# Altium schematic symbol library jlcpcb_2025_04_capacitors_extended_0603.schlib: 3668 symbols (part 1 of 20)
Pins are listed as number, name and electrical type; pins without a type are passive.

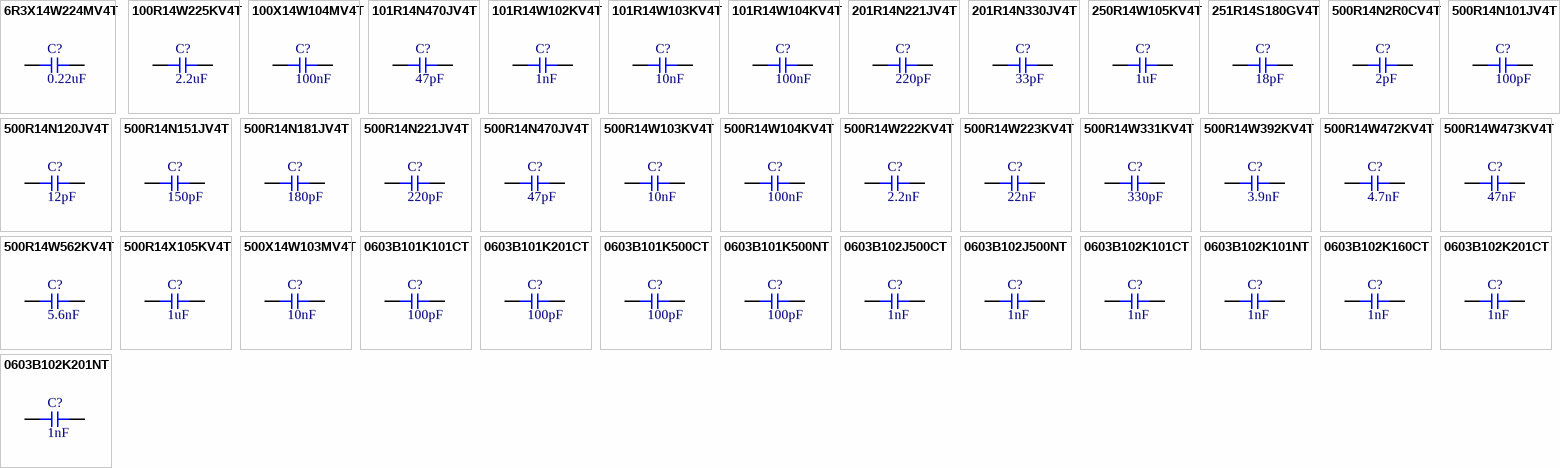
[diagram p0: symbols 6R3X14W224MV4T to 0603B102K201NT]

## 6R3X14W224MV4T
designator C?  Capacitance: 0.22uF  (hidden comment: *)
Capacitor, Ceramic (MLCC), 0.22uF, ±20%, 6.3V, X7R, ±20%, SMD 0603; Manufacturer: Johanson Dielectrics; Manufacturer Part Number: 6R3X14W224MV4T; Package Size: 0603; JLCPCB Basic Part: No; JLCPCB Part Number: C5370270; Supplier 1: LCSC; Category: Capacitors - MLCC; Supplier Part Number 1: C5370270; Tolerance: ±20%; Voltage Rating: 6.3V; Temperature Coefficient: X7R; RoHS: Yes; ComponentLink1Description: Datasheet; ComponentLink1URL: https://wmsc.lcsc.com/wmsc/upload/file/pdf/v2/lcsc/2304071000_Johanson-Dielectrics-6R3X14W224MV4T_C5370270.pdf; ComponentLink2Description: JLCPCB Part URL; ComponentLink2URL: https://jlcpcb.com/partdetail/C5370270; ComponentLink3Description: LCSC Part URL; ComponentLink3URL: https://lcsc.com/product-detail/Multilayer-Ceramic-Capacitors-MLCC---SMD-SMT_Johanson-Dielectrics-Johanson-Dielectrics-6R3X14W224MV4T_C5370270.html
footprint CAP-0603 (0603 (1608M) Capacitor)
pins: 1, 2

## 100R14W225KV4T
designator C?  Capacitance: 2.2uF  (hidden comment: *)
Capacitor, Ceramic (MLCC), 2.2uF, ±10%, 10V, X7R, ±10%, SMD 0603; Manufacturer: Johanson Dielectrics; Manufacturer Part Number: 100R14W225KV4T; Package Size: 0603; JLCPCB Basic Part: No; JLCPCB Part Number: C2917682; Supplier 1: LCSC; Category: Capacitors - MLCC; Supplier Part Number 1: C2917682; Tolerance: ±10%; Voltage Rating: 10V; Temperature Coefficient: X7R; RoHS: Yes; ComponentLink1Description: Datasheet; ComponentLink1URL: https://wmsc.lcsc.com/wmsc/upload/file/pdf/v2/lcsc/2303281630_Johanson-Dielectrics-100R14W225KV4T_C2917682.pdf; ComponentLink2Description: JLCPCB Part URL; ComponentLink2URL: https://jlcpcb.com/partdetail/C2917682; ComponentLink3Description: LCSC Part URL; ComponentLink3URL: https://lcsc.com/product-detail/Multilayer-Ceramic-Capacitors-MLCC---SMD-SMT_Johanson-Dielectrics-Johanson-Dielectrics-100R14W225KV4T_C2917682.html
footprint CAP-0603 (0603 (1608M) Capacitor)
pins: 1, 2

## 100X14W104MV4T
designator C?  Capacitance: 100nF  (hidden comment: *)
Capacitor, Ceramic (MLCC), 100nF, ±20%, 10V, X7R, ±20%, SMD 0603; Manufacturer: Johanson Dielectrics; Manufacturer Part Number: 100X14W104MV4T; Package Size: 0603; JLCPCB Basic Part: No; JLCPCB Part Number: C2167449; Supplier 1: LCSC; Category: Capacitors - MLCC; Supplier Part Number 1: C2167449; Tolerance: ±20%; Voltage Rating: 10V; Temperature Coefficient: X7R; RoHS: Yes; ComponentLink1Description: Datasheet; ComponentLink1URL: https://wmsc.lcsc.com/wmsc/upload/file/pdf/v2/lcsc/2304140030_Johanson-Dielectrics-100X14W104MV4T_C2167449.pdf; ComponentLink2Description: JLCPCB Part URL; ComponentLink2URL: https://jlcpcb.com/partdetail/C2167449; ComponentLink3Description: LCSC Part URL; ComponentLink3URL: https://lcsc.com/product-detail/Multilayer-Ceramic-Capacitors-MLCC---SMD-SMT_Johanson-Dielectrics-Johanson-Dielectrics-100X14W104MV4T_C2167449.html
footprint CAP-0603 (0603 (1608M) Capacitor)
pins: 1, 2

## 101R14N470JV4T
designator C?  Capacitance: 47pF  (hidden comment: *)
Capacitor, Ceramic (MLCC), 47pF, ±5%, 100V, NP0, ±5%, SMD 0603; Manufacturer: Johanson Dielectrics; Manufacturer Part Number: 101R14N470JV4T; Package Size: 0603; JLCPCB Basic Part: No; JLCPCB Part Number: C431639; Supplier 1: LCSC; Category: Capacitors - MLCC; Supplier Part Number 1: C431639; Tolerance: ±5%; Voltage Rating: 100V; Temperature Coefficient: NP0; RoHS: Yes; ComponentLink1Description: Datasheet; ComponentLink1URL: https://wmsc.lcsc.com/wmsc/upload/file/pdf/v2/lcsc/2304140030_Johanson-Dielectrics-101R14N470JV4T_C431639.pdf; ComponentLink2Description: JLCPCB Part URL; ComponentLink2URL: https://jlcpcb.com/partdetail/C431639; ComponentLink3Description: LCSC Part URL; ComponentLink3URL: https://lcsc.com/product-detail/Multilayer-Ceramic-Capacitors-MLCC---SMD-SMT_Johanson-Dielectrics-Johanson-Dielectrics-101R14N470JV4T_C431639.html
footprint CAP-0603 (0603 (1608M) Capacitor)
pins: 1, 2

## 101R14W102KV4T
designator C?  Capacitance: 1nF  (hidden comment: *)
Capacitor, Ceramic (MLCC), 1nF, 100V, X7R, SMD 0603; Manufacturer: Johanson Dielectrics; Manufacturer Part Number: 101R14W102KV4T; Package Size: 0603; JLCPCB Basic Part: No; JLCPCB Part Number: C2917686; Supplier 1: LCSC; Category: Capacitors - MLCC; Supplier Part Number 1: C2917686; Voltage Rating: 100V; Temperature Coefficient: X7R; RoHS: Yes; ComponentLink1Description: Datasheet; ComponentLink1URL: https://wmsc.lcsc.com/wmsc/upload/file/pdf/v2/lcsc/2203311630_Johanson-Dielectrics-101R14W102KV4T_C2917686.pdf; ComponentLink2Description: JLCPCB Part URL; ComponentLink2URL: https://jlcpcb.com/partdetail/C2917686; ComponentLink3Description: LCSC Part URL; ComponentLink3URL: https://lcsc.com/product-detail/Multilayer-Ceramic-Capacitors-MLCC---SMD-SMT_Johanson-Dielectrics-Johanson-Dielectrics-101R14W102KV4T_C2917686.html
footprint CAP-0603 (0603 (1608M) Capacitor)
pins: 1, 2

## 101R14W103KV4T
designator C?  Capacitance: 10nF  (hidden comment: *)
Capacitor, Ceramic (MLCC), 10nF, ±10%, 100V, X7R, ±10%, SMD 0603; Manufacturer: Johanson Dielectrics; Manufacturer Part Number: 101R14W103KV4T; Package Size: 0603; JLCPCB Basic Part: No; JLCPCB Part Number: C431000; Supplier 1: LCSC; Category: Capacitors - MLCC; Supplier Part Number 1: C431000; Tolerance: ±10%; Voltage Rating: 100V; Temperature Coefficient: X7R; RoHS: Yes; ComponentLink1Description: Datasheet; ComponentLink1URL: https://wmsc.lcsc.com/wmsc/upload/file/pdf/v2/lcsc/1912111437_Johanson-Dielectrics-101R14W103KV4T_C431000.pdf; ComponentLink2Description: JLCPCB Part URL; ComponentLink2URL: https://jlcpcb.com/partdetail/C431000; ComponentLink3Description: LCSC Part URL; ComponentLink3URL: https://lcsc.com/product-detail/Multilayer-Ceramic-Capacitors-MLCC---SMD-SMT_Johanson-Dielectrics-Johanson-Dielectrics-101R14W103KV4T_C431000.html
footprint CAP-0603 (0603 (1608M) Capacitor)
pins: 1, 2

## 101R14W104KV4T
designator C?  Capacitance: 100nF  (hidden comment: *)
Capacitor, Ceramic (MLCC), 100nF, ±10%, 100V, X7R, ±10%, SMD 0603; Manufacturer: Johanson Dielectrics; Manufacturer Part Number: 101R14W104KV4T; Package Size: 0603; JLCPCB Basic Part: No; JLCPCB Part Number: C431640; Supplier 1: LCSC; Category: Capacitors - MLCC; Supplier Part Number 1: C431640; Tolerance: ±10%; Voltage Rating: 100V; Temperature Coefficient: X7R; RoHS: Yes; ComponentLink1Description: Datasheet; ComponentLink1URL: https://wmsc.lcsc.com/wmsc/upload/file/pdf/v2/lcsc/2304140030_Johanson-Dielectrics-101R14W104KV4T_C431640.pdf; ComponentLink2Description: JLCPCB Part URL; ComponentLink2URL: https://jlcpcb.com/partdetail/C431640; ComponentLink3Description: LCSC Part URL; ComponentLink3URL: https://lcsc.com/product-detail/Multilayer-Ceramic-Capacitors-MLCC---SMD-SMT_Johanson-Dielectrics-Johanson-Dielectrics-101R14W104KV4T_C431640.html
footprint CAP-0603 (0603 (1608M) Capacitor)
pins: 1, 2

## 201R14N221JV4T
designator C?  Capacitance: 220pF  (hidden comment: *)
Capacitor, Ceramic (MLCC), 220pF, 200V, SMD 0603; Manufacturer: Johanson Dielectrics; Manufacturer Part Number: 201R14N221JV4T; Package Size: 0603; JLCPCB Basic Part: No; JLCPCB Part Number: C2917711; Supplier 1: LCSC; Category: Capacitors - MLCC; Supplier Part Number 1: C2917711; Voltage Rating: 200V; RoHS: Yes; ComponentLink1Description: Datasheet; ComponentLink1URL: https://wmsc.lcsc.com/wmsc/upload/file/pdf/v2/lcsc/2206291630_Johanson-Dielectrics-201R14N221JV4T_C2917711.pdf; ComponentLink2Description: JLCPCB Part URL; ComponentLink2URL: https://jlcpcb.com/partdetail/C2917711; ComponentLink3Description: LCSC Part URL; ComponentLink3URL: https://lcsc.com/product-detail/Multilayer-Ceramic-Capacitors-MLCC---SMD-SMT_Johanson-Dielectrics-Johanson-Dielectrics-201R14N221JV4T_C2917711.html
footprint CAP-0603 (0603 (1608M) Capacitor)
pins: 1, 2

## 201R14N330JV4T
designator C?  Capacitance: 33pF  (hidden comment: *)
Capacitor, Ceramic (MLCC), 33pF, 200V, SMD 0603; Manufacturer: Johanson Dielectrics; Manufacturer Part Number: 201R14N330JV4T; Package Size: 0603; JLCPCB Basic Part: No; JLCPCB Part Number: C2917713; Supplier 1: LCSC; Category: Capacitors - MLCC; Supplier Part Number 1: C2917713; Voltage Rating: 200V; RoHS: Yes; ComponentLink1Description: Datasheet; ComponentLink1URL: https://wmsc.lcsc.com/wmsc/upload/file/pdf/v2/lcsc/2205250916_Johanson-Dielectrics-201R14N330JV4T_C2917713.pdf; ComponentLink2Description: JLCPCB Part URL; ComponentLink2URL: https://jlcpcb.com/partdetail/C2917713; ComponentLink3Description: LCSC Part URL; ComponentLink3URL: https://lcsc.com/product-detail/Multilayer-Ceramic-Capacitors-MLCC---SMD-SMT_Johanson-Dielectrics-Johanson-Dielectrics-201R14N330JV4T_C2917713.html
footprint CAP-0603 (0603 (1608M) Capacitor)
pins: 1, 2

## 250R14W105KV4T
designator C?  Capacitance: 1uF  (hidden comment: *)
Capacitor, Ceramic (MLCC), 1uF, ±10%, 25V, X7R, ±10%, SMD 0603; Manufacturer: Johanson Dielectrics; Manufacturer Part Number: 250R14W105KV4T; Package Size: 0603; JLCPCB Basic Part: No; JLCPCB Part Number: C431003; Supplier 1: LCSC; Category: Capacitors - MLCC; Supplier Part Number 1: C431003; Tolerance: ±10%; Voltage Rating: 25V; Temperature Coefficient: X7R; RoHS: Yes; ComponentLink1Description: Datasheet; ComponentLink1URL: https://wmsc.lcsc.com/wmsc/upload/file/pdf/v2/lcsc/2304140030_Johanson-Dielectrics-250R14W105KV4T_C431003.pdf; ComponentLink2Description: JLCPCB Part URL; ComponentLink2URL: https://jlcpcb.com/partdetail/C431003; ComponentLink3Description: LCSC Part URL; ComponentLink3URL: https://lcsc.com/product-detail/Multilayer-Ceramic-Capacitors-MLCC---SMD-SMT_Johanson-Dielectrics-Johanson-Dielectrics-250R14W105KV4T_C431003.html
footprint CAP-0603 (0603 (1608M) Capacitor)
pins: 1, 2

## 251R14S180GV4T
designator C?  Capacitance: 18pF  (hidden comment: *)
Capacitor, Ceramic (MLCC), 18pF, ±2%, 250V, C0G, ±2%, SMD 0603; Manufacturer: Johanson Dielectrics; Manufacturer Part Number: 251R14S180GV4T; Package Size: 0603; JLCPCB Basic Part: No; JLCPCB Part Number: C3881816; Supplier 1: LCSC; Category: Capacitors - MLCC; Supplier Part Number 1: C3881816; Tolerance: ±2%; Voltage Rating: 250V; Temperature Coefficient: C0G; RoHS: Yes; ComponentLink1Description: Datasheet; ComponentLink2Description: JLCPCB Part URL; ComponentLink2URL: https://jlcpcb.com/partdetail/C3881816; ComponentLink3Description: LCSC Part URL; ComponentLink3URL: https://lcsc.com/product-detail/Multilayer-Ceramic-Capacitors-MLCC---SMD-SMT_Johanson-Dielectrics-Johanson-Dielectrics-251R14S180GV4T_C3881816.html
footprint CAP-0603 (0603 (1608M) Capacitor)
pins: 1, 2

## 500R14N2R0CV4T
designator C?  Capacitance: 2pF  (hidden comment: *)
Capacitor, Ceramic (MLCC), 2pF, 50V, NP0, SMD 0603; Manufacturer: Johanson Dielectrics; Manufacturer Part Number: 500R14N2R0CV4T; Package Size: 0603; JLCPCB Basic Part: No; JLCPCB Part Number: C2917750; Supplier 1: LCSC; Category: Capacitors - MLCC; Supplier Part Number 1: C2917750; Voltage Rating: 50V; Temperature Coefficient: NP0; RoHS: Yes; ComponentLink1Description: Datasheet; ComponentLink1URL: https://wmsc.lcsc.com/wmsc/upload/file/pdf/v2/lcsc/2203311730_Johanson-Dielectrics-500R14N2R0CV4T_C2917750.pdf; ComponentLink2Description: JLCPCB Part URL; ComponentLink2URL: https://jlcpcb.com/partdetail/C2917750; ComponentLink3Description: LCSC Part URL; ComponentLink3URL: https://lcsc.com/product-detail/Multilayer-Ceramic-Capacitors-MLCC---SMD-SMT_Johanson-Dielectrics-Johanson-Dielectrics-500R14N2R0CV4T_C2917750.html
footprint CAP-0603 (0603 (1608M) Capacitor)
pins: 1, 2

## 500R14N101JV4T
designator C?  Capacitance: 100pF  (hidden comment: *)
Capacitor, Ceramic (MLCC), 100pF, ±5%, 50V, NP0, ±5%, SMD 0603; Manufacturer: Johanson Dielectrics; Manufacturer Part Number: 500R14N101JV4T; Package Size: 0603; JLCPCB Basic Part: No; JLCPCB Part Number: C173273; Supplier 1: LCSC; Category: Capacitors - MLCC; Supplier Part Number 1: C173273; Tolerance: ±5%; Voltage Rating: 50V; Temperature Coefficient: NP0; RoHS: Yes; ComponentLink1Description: Datasheet; ComponentLink1URL: https://wmsc.lcsc.com/wmsc/upload/file/pdf/v2/lcsc/2304140030_Johanson-Dielectrics-500R14N101JV4T_C173273.pdf; ComponentLink2Description: JLCPCB Part URL; ComponentLink2URL: https://jlcpcb.com/partdetail/C173273; ComponentLink3Description: LCSC Part URL; ComponentLink3URL: https://lcsc.com/product-detail/Multilayer-Ceramic-Capacitors-MLCC---SMD-SMT_Johanson-Dielectrics-Johanson-Dielectrics-500R14N101JV4T_C173273.html
footprint CAP-0603 (0603 (1608M) Capacitor)
pins: 1, 2

## 500R14N120JV4T
designator C?  Capacitance: 12pF  (hidden comment: *)
Capacitor, Ceramic (MLCC), 12pF, ±5%, 50V, NP0, ±5%, SMD 0603; Manufacturer: Johanson Dielectrics; Manufacturer Part Number: 500R14N120JV4T; Package Size: 0603; JLCPCB Basic Part: No; JLCPCB Part Number: C2176561; Supplier 1: LCSC; Category: Capacitors - MLCC; Supplier Part Number 1: C2176561; Tolerance: ±5%; Voltage Rating: 50V; Temperature Coefficient: NP0; RoHS: Yes; ComponentLink1Description: Datasheet; ComponentLink1URL: https://wmsc.lcsc.com/wmsc/upload/file/pdf/v2/lcsc/2304140030_Johanson-Dielectrics-500R14N120JV4T_C2176561.pdf; ComponentLink2Description: JLCPCB Part URL; ComponentLink2URL: https://jlcpcb.com/partdetail/C2176561; ComponentLink3Description: LCSC Part URL; ComponentLink3URL: https://lcsc.com/product-detail/Multilayer-Ceramic-Capacitors-MLCC---SMD-SMT_Johanson-Dielectrics-Johanson-Dielectrics-500R14N120JV4T_C2176561.html
footprint CAP-0603 (0603 (1608M) Capacitor)
pins: 1, 2

## 500R14N151JV4T
designator C?  Capacitance: 150pF  (hidden comment: *)
Capacitor, Ceramic (MLCC), 150pF, ±5%, 50V, NP0, ±5%, SMD 0603; Manufacturer: Johanson Dielectrics; Manufacturer Part Number: 500R14N151JV4T; Package Size: 0603; JLCPCB Basic Part: No; JLCPCB Part Number: C431009; Supplier 1: LCSC; Category: Capacitors - MLCC; Supplier Part Number 1: C431009; Tolerance: ±5%; Voltage Rating: 50V; Temperature Coefficient: NP0; RoHS: Yes; ComponentLink1Description: Datasheet; ComponentLink1URL: https://wmsc.lcsc.com/wmsc/upload/file/pdf/v2/lcsc/2304140030_Johanson-Dielectrics-500R14N151JV4T_C431009.pdf; ComponentLink2Description: JLCPCB Part URL; ComponentLink2URL: https://jlcpcb.com/partdetail/C431009; ComponentLink3Description: LCSC Part URL; ComponentLink3URL: https://lcsc.com/product-detail/Multilayer-Ceramic-Capacitors-MLCC---SMD-SMT_Johanson-Dielectrics-Johanson-Dielectrics-500R14N151JV4T_C431009.html
footprint CAP-0603 (0603 (1608M) Capacitor)
pins: 1, 2

## 500R14N181JV4T
designator C?  Capacitance: 180pF  (hidden comment: *)
Capacitor, Ceramic (MLCC), 180pF, ±5%, 50V, NP0, ±5%, SMD 0603; Manufacturer: Johanson Dielectrics; Manufacturer Part Number: 500R14N181JV4T; Package Size: 0603; JLCPCB Basic Part: No; JLCPCB Part Number: C2917748; Supplier 1: LCSC; Category: Capacitors - MLCC; Supplier Part Number 1: C2917748; Tolerance: ±5%; Voltage Rating: 50V; Temperature Coefficient: NP0; RoHS: Yes; ComponentLink1Description: Datasheet; ComponentLink1URL: https://wmsc.lcsc.com/wmsc/upload/file/pdf/v2/lcsc/2203311630_Johanson-Dielectrics-500R14N181JV4T_C2917748.pdf; ComponentLink2Description: JLCPCB Part URL; ComponentLink2URL: https://jlcpcb.com/partdetail/C2917748; ComponentLink3Description: LCSC Part URL; ComponentLink3URL: https://lcsc.com/product-detail/Multilayer-Ceramic-Capacitors-MLCC---SMD-SMT_Johanson-Dielectrics-Johanson-Dielectrics-500R14N181JV4T_C2917748.html
footprint CAP-0603 (0603 (1608M) Capacitor)
pins: 1, 2

## 500R14N221JV4T
designator C?  Capacitance: 220pF  (hidden comment: *)
Capacitor, Ceramic (MLCC), 220pF, ±5%, 50V, NP0, ±5%, SMD 0603; Manufacturer: Johanson Dielectrics; Manufacturer Part Number: 500R14N221JV4T; Package Size: 0603; JLCPCB Basic Part: No; JLCPCB Part Number: C431002; Supplier 1: LCSC; Category: Capacitors - MLCC; Supplier Part Number 1: C431002; Tolerance: ±5%; Voltage Rating: 50V; Temperature Coefficient: NP0; RoHS: Yes; ComponentLink1Description: Datasheet; ComponentLink1URL: https://wmsc.lcsc.com/wmsc/upload/file/pdf/v2/lcsc/2304140030_Johanson-Dielectrics-500R14N221JV4T_C431002.pdf; ComponentLink2Description: JLCPCB Part URL; ComponentLink2URL: https://jlcpcb.com/partdetail/C431002; ComponentLink3Description: LCSC Part URL; ComponentLink3URL: https://lcsc.com/product-detail/Multilayer-Ceramic-Capacitors-MLCC---SMD-SMT_Johanson-Dielectrics-Johanson-Dielectrics-500R14N221JV4T_C431002.html
footprint CAP-0603 (0603 (1608M) Capacitor)
pins: 1, 2

## 500R14N470JV4T
designator C?  Capacitance: 47pF  (hidden comment: *)
Capacitor, Ceramic (MLCC), 47pF, ±5%, 50V, NP0, ±5%, SMD 0603; Manufacturer: Johanson Dielectrics; Manufacturer Part Number: 500R14N470JV4T; Package Size: 0603; JLCPCB Basic Part: No; JLCPCB Part Number: C173269; Supplier 1: LCSC; Category: Capacitors - MLCC; Supplier Part Number 1: C173269; Tolerance: ±5%; Voltage Rating: 50V; Temperature Coefficient: NP0; RoHS: Yes; ComponentLink1Description: Datasheet; ComponentLink1URL: https://wmsc.lcsc.com/wmsc/upload/file/pdf/v2/lcsc/2304140030_Johanson-Dielectrics-500R14N470JV4T_C173269.pdf; ComponentLink2Description: JLCPCB Part URL; ComponentLink2URL: https://jlcpcb.com/partdetail/C173269; ComponentLink3Description: LCSC Part URL; ComponentLink3URL: https://lcsc.com/product-detail/Multilayer-Ceramic-Capacitors-MLCC---SMD-SMT_Johanson-Dielectrics-Johanson-Dielectrics-500R14N470JV4T_C173269.html
footprint CAP-0603 (0603 (1608M) Capacitor)
pins: 1, 2

## 500R14W103KV4T
designator C?  Capacitance: 10nF  (hidden comment: *)
Capacitor, Ceramic (MLCC), 10nF, ±10%, 50V, X7R, ±10%, SMD 0603; Manufacturer: Johanson Dielectrics; Manufacturer Part Number: 500R14W103KV4T; Package Size: 0603; JLCPCB Basic Part: No; JLCPCB Part Number: C173276; Supplier 1: LCSC; Category: Capacitors - MLCC; Supplier Part Number 1: C173276; Tolerance: ±10%; Voltage Rating: 50V; Temperature Coefficient: X7R; RoHS: Yes; ComponentLink1Description: Datasheet; ComponentLink1URL: https://wmsc.lcsc.com/wmsc/upload/file/pdf/v2/lcsc/2304140030_Johanson-Dielectrics-500R14W103KV4T_C173276.pdf; ComponentLink2Description: JLCPCB Part URL; ComponentLink2URL: https://jlcpcb.com/partdetail/C173276; ComponentLink3Description: LCSC Part URL; ComponentLink3URL: https://lcsc.com/product-detail/Multilayer-Ceramic-Capacitors-MLCC---SMD-SMT_Johanson-Dielectrics-Johanson-Dielectrics-500R14W103KV4T_C173276.html
footprint CAP-0603 (0603 (1608M) Capacitor)
pins: 1, 2

## 500R14W104KV4T
designator C?  Capacitance: 100nF  (hidden comment: *)
Capacitor, Ceramic (MLCC), 100nF, ±10%, 50V, X7R, ±10%, SMD 0603; Manufacturer: Johanson Dielectrics; Manufacturer Part Number: 500R14W104KV4T; Package Size: 0603; JLCPCB Basic Part: No; JLCPCB Part Number: C173232; Supplier 1: LCSC; Category: Capacitors - MLCC; Supplier Part Number 1: C173232; Tolerance: ±10%; Voltage Rating: 50V; Temperature Coefficient: X7R; RoHS: Yes; ComponentLink1Description: Datasheet; ComponentLink1URL: https://wmsc.lcsc.com/wmsc/upload/file/pdf/v2/lcsc/2304140030_Johanson-Dielectrics-500R14W104KV4T_C173232.pdf; ComponentLink2Description: JLCPCB Part URL; ComponentLink2URL: https://jlcpcb.com/partdetail/C173232; ComponentLink3Description: LCSC Part URL; ComponentLink3URL: https://lcsc.com/product-detail/Multilayer-Ceramic-Capacitors-MLCC---SMD-SMT_Johanson-Dielectrics-Johanson-Dielectrics-500R14W104KV4T_C173232.html
footprint CAP-0603 (0603 (1608M) Capacitor)
pins: 1, 2

## 500R14W222KV4T
designator C?  Capacitance: 2.2nF  (hidden comment: *)
Capacitor, Ceramic (MLCC), 2.2nF, ±10%, 50V, X7R, ±10%, SMD 0603; Manufacturer: Johanson Dielectrics; Manufacturer Part Number: 500R14W222KV4T; Package Size: 0603; JLCPCB Basic Part: No; JLCPCB Part Number: C431660; Supplier 1: LCSC; Category: Capacitors - MLCC; Supplier Part Number 1: C431660; Tolerance: ±10%; Voltage Rating: 50V; Temperature Coefficient: X7R; RoHS: Yes; ComponentLink1Description: Datasheet; ComponentLink1URL: https://wmsc.lcsc.com/wmsc/upload/file/pdf/v2/lcsc/2304140030_Johanson-Dielectrics-500R14W222KV4T_C431660.pdf; ComponentLink2Description: JLCPCB Part URL; ComponentLink2URL: https://jlcpcb.com/partdetail/C431660; ComponentLink3Description: LCSC Part URL; ComponentLink3URL: https://lcsc.com/product-detail/Multilayer-Ceramic-Capacitors-MLCC---SMD-SMT_Johanson-Dielectrics-Johanson-Dielectrics-500R14W222KV4T_C431660.html
footprint CAP-0603 (0603 (1608M) Capacitor)
pins: 1, 2

## 500R14W223KV4T
designator C?  Capacitance: 22nF  (hidden comment: *)
Capacitor, Ceramic (MLCC), 22nF, ±10%, 50V, X7R, ±10%, SMD 0603; Manufacturer: Johanson Dielectrics; Manufacturer Part Number: 500R14W223KV4T; Package Size: 0603; JLCPCB Basic Part: No; JLCPCB Part Number: C431661; Supplier 1: LCSC; Category: Capacitors - MLCC; Supplier Part Number 1: C431661; Tolerance: ±10%; Voltage Rating: 50V; Temperature Coefficient: X7R; RoHS: Yes; ComponentLink1Description: Datasheet; ComponentLink1URL: https://wmsc.lcsc.com/wmsc/upload/file/pdf/v2/lcsc/2304140030_Johanson-Dielectrics-500R14W223KV4T_C431661.pdf; ComponentLink2Description: JLCPCB Part URL; ComponentLink2URL: https://jlcpcb.com/partdetail/C431661; ComponentLink3Description: LCSC Part URL; ComponentLink3URL: https://lcsc.com/product-detail/Multilayer-Ceramic-Capacitors-MLCC---SMD-SMT_Johanson-Dielectrics-Johanson-Dielectrics-500R14W223KV4T_C431661.html
footprint CAP-0603 (0603 (1608M) Capacitor)
pins: 1, 2

## 500R14W331KV4T
designator C?  Capacitance: 330pF  (hidden comment: *)
Capacitor, Ceramic (MLCC), 330pF, ±10%, 50V, X7R, ±10%, SMD 0603; Manufacturer: Johanson Dielectrics; Manufacturer Part Number: 500R14W331KV4T; Package Size: 0603; JLCPCB Basic Part: No; JLCPCB Part Number: C431008; Supplier 1: LCSC; Category: Capacitors - MLCC; Supplier Part Number 1: C431008; Tolerance: ±10%; Voltage Rating: 50V; Temperature Coefficient: X7R; RoHS: Yes; ComponentLink1Description: Datasheet; ComponentLink1URL: https://wmsc.lcsc.com/wmsc/upload/file/pdf/v2/lcsc/2304140030_Johanson-Dielectrics-500R14W331KV4T_C431008.pdf; ComponentLink2Description: JLCPCB Part URL; ComponentLink2URL: https://jlcpcb.com/partdetail/C431008; ComponentLink3Description: LCSC Part URL; ComponentLink3URL: https://lcsc.com/product-detail/Multilayer-Ceramic-Capacitors-MLCC---SMD-SMT_Johanson-Dielectrics-Johanson-Dielectrics-500R14W331KV4T_C431008.html
footprint CAP-0603 (0603 (1608M) Capacitor)
pins: 1, 2

## 500R14W392KV4T
designator C?  Capacitance: 3.9nF  (hidden comment: *)
Capacitor, Ceramic (MLCC), 3.9nF, ±10%, 50V, X7R, ±10%, SMD 0603; Manufacturer: Johanson Dielectrics; Manufacturer Part Number: 500R14W392KV4T; Package Size: 0603; JLCPCB Basic Part: No; JLCPCB Part Number: C431663; Supplier 1: LCSC; Category: Capacitors - MLCC; Supplier Part Number 1: C431663; Tolerance: ±10%; Voltage Rating: 50V; Temperature Coefficient: X7R; RoHS: Yes; ComponentLink1Description: Datasheet; ComponentLink1URL: https://wmsc.lcsc.com/wmsc/upload/file/pdf/v2/lcsc/2304140030_Johanson-Dielectrics-500R14W392KV4T_C431663.pdf; ComponentLink2Description: JLCPCB Part URL; ComponentLink2URL: https://jlcpcb.com/partdetail/C431663; ComponentLink3Description: LCSC Part URL; ComponentLink3URL: https://lcsc.com/product-detail/Multilayer-Ceramic-Capacitors-MLCC---SMD-SMT_Johanson-Dielectrics-Johanson-Dielectrics-500R14W392KV4T_C431663.html
footprint CAP-0603 (0603 (1608M) Capacitor)
pins: 1, 2

## 500R14W472KV4T
designator C?  Capacitance: 4.7nF  (hidden comment: *)
Capacitor, Ceramic (MLCC), 4.7nF, ±10%, 50V, X7R, ±10%, SMD 0603; Manufacturer: Johanson Dielectrics; Manufacturer Part Number: 500R14W472KV4T; Package Size: 0603; JLCPCB Basic Part: No; JLCPCB Part Number: C430999; Supplier 1: LCSC; Category: Capacitors - MLCC; Supplier Part Number 1: C430999; Tolerance: ±10%; Voltage Rating: 50V; Temperature Coefficient: X7R; RoHS: Yes; ComponentLink1Description: Datasheet; ComponentLink1URL: https://wmsc.lcsc.com/wmsc/upload/file/pdf/v2/lcsc/2304140030_Johanson-Dielectrics-500R14W472KV4T_C430999.pdf; ComponentLink2Description: JLCPCB Part URL; ComponentLink2URL: https://jlcpcb.com/partdetail/C430999; ComponentLink3Description: LCSC Part URL; ComponentLink3URL: https://lcsc.com/product-detail/Multilayer-Ceramic-Capacitors-MLCC---SMD-SMT_Johanson-Dielectrics-Johanson-Dielectrics-500R14W472KV4T_C430999.html
footprint CAP-0603 (0603 (1608M) Capacitor)
pins: 1, 2

## 500R14W473KV4T
designator C?  Capacitance: 47nF  (hidden comment: *)
Capacitor, Ceramic (MLCC), 47nF, ±10%, 50V, X7R, ±10%, SMD 0603; Manufacturer: Johanson Dielectrics; Manufacturer Part Number: 500R14W473KV4T; Package Size: 0603; JLCPCB Basic Part: No; JLCPCB Part Number: C430998; Supplier 1: LCSC; Category: Capacitors - MLCC; Supplier Part Number 1: C430998; Tolerance: ±10%; Voltage Rating: 50V; Temperature Coefficient: X7R; RoHS: Yes; ComponentLink1Description: Datasheet; ComponentLink1URL: https://wmsc.lcsc.com/wmsc/upload/file/pdf/v2/lcsc/2304140030_Johanson-Dielectrics-500R14W473KV4T_C430998.pdf; ComponentLink2Description: JLCPCB Part URL; ComponentLink2URL: https://jlcpcb.com/partdetail/C430998; ComponentLink3Description: LCSC Part URL; ComponentLink3URL: https://lcsc.com/product-detail/Multilayer-Ceramic-Capacitors-MLCC---SMD-SMT_Johanson-Dielectrics-Johanson-Dielectrics-500R14W473KV4T_C430998.html
footprint CAP-0603 (0603 (1608M) Capacitor)
pins: 1, 2

## 500R14W562KV4T
designator C?  Capacitance: 5.6nF  (hidden comment: *)
Capacitor, Ceramic (MLCC), 5.6nF, ±10%, 50V, X7R, ±10%, SMD 0603; Manufacturer: Johanson Dielectrics; Manufacturer Part Number: 500R14W562KV4T; Package Size: 0603; JLCPCB Basic Part: No; JLCPCB Part Number: C431664; Supplier 1: LCSC; Category: Capacitors - MLCC; Supplier Part Number 1: C431664; Tolerance: ±10%; Voltage Rating: 50V; Temperature Coefficient: X7R; RoHS: Yes; ComponentLink1Description: Datasheet; ComponentLink1URL: https://wmsc.lcsc.com/wmsc/upload/file/pdf/v2/lcsc/2304140030_Johanson-Dielectrics-500R14W562KV4T_C431664.pdf; ComponentLink2Description: JLCPCB Part URL; ComponentLink2URL: https://jlcpcb.com/partdetail/C431664; ComponentLink3Description: LCSC Part URL; ComponentLink3URL: https://lcsc.com/product-detail/Multilayer-Ceramic-Capacitors-MLCC---SMD-SMT_Johanson-Dielectrics-Johanson-Dielectrics-500R14W562KV4T_C431664.html
footprint CAP-0603 (0603 (1608M) Capacitor)
pins: 1, 2

## 500R14X105KV4T
designator C?  Capacitance: 1uF  (hidden comment: *)
Capacitor, Ceramic (MLCC), 1uF, ±10%, 50V, X5R, ±10%, SMD 0603; Manufacturer: Johanson Dielectrics; Manufacturer Part Number: 500R14X105KV4T; Package Size: 0603; JLCPCB Basic Part: No; JLCPCB Part Number: C431665; Supplier 1: LCSC; Category: Capacitors - MLCC; Supplier Part Number 1: C431665; Tolerance: ±10%; Voltage Rating: 50V; Temperature Coefficient: X5R; RoHS: Yes; ComponentLink1Description: Datasheet; ComponentLink1URL: https://wmsc.lcsc.com/wmsc/upload/file/pdf/v2/lcsc/1912111437_Johanson-Dielectrics-500R14X105KV4T_C431665.pdf; ComponentLink2Description: JLCPCB Part URL; ComponentLink2URL: https://jlcpcb.com/partdetail/C431665; ComponentLink3Description: LCSC Part URL; ComponentLink3URL: https://lcsc.com/product-detail/Multilayer-Ceramic-Capacitors-MLCC---SMD-SMT_Johanson-Dielectrics-Johanson-Dielectrics-500R14X105KV4T_C431665.html
footprint CAP-0603 (0603 (1608M) Capacitor)
pins: 1, 2

## 500X14W103MV4T
designator C?  Capacitance: 10nF  (hidden comment: *)
Capacitor, Ceramic (MLCC), 10nF, ±20%, 50V, X7R, ±20%, SMD 0603; Manufacturer: Johanson Dielectrics; Manufacturer Part Number: 500X14W103MV4T; Package Size: 0603; JLCPCB Basic Part: No; JLCPCB Part Number: C2167304; Supplier 1: LCSC; Category: Capacitors - MLCC; Supplier Part Number 1: C2167304; Tolerance: ±20%; Voltage Rating: 50V; Temperature Coefficient: X7R; RoHS: Yes; ComponentLink1Description: Datasheet; ComponentLink1URL: https://wmsc.lcsc.com/wmsc/upload/file/pdf/v2/lcsc/2304140030_Johanson-Dielectrics-500X14W103MV4T_C2167304.pdf; ComponentLink2Description: JLCPCB Part URL; ComponentLink2URL: https://jlcpcb.com/partdetail/C2167304; ComponentLink3Description: LCSC Part URL; ComponentLink3URL: https://lcsc.com/product-detail/Multilayer-Ceramic-Capacitors-MLCC---SMD-SMT_Johanson-Dielectrics-Johanson-Dielectrics-500X14W103MV4T_C2167304.html
footprint CAP-0603 (0603 (1608M) Capacitor)
pins: 1, 2

## 0603B101K101CT
designator C?  Capacitance: 100pF  (hidden comment: *)
Capacitor, Ceramic (MLCC), 100pF, ±10%, 100V, X7R, ±10%, SMD 0603; Manufacturer: Walsin Tech Corp; Manufacturer Part Number: 0603B101K101CT; Package Size: 0603; JLCPCB Basic Part: No; JLCPCB Part Number: C424853; Supplier 1: LCSC; Category: Capacitors - MLCC; Supplier Part Number 1: C424853; Tolerance: ±10%; Voltage Rating: 100V; Temperature Coefficient: X7R; RoHS: Yes; ComponentLink1Description: Datasheet; ComponentLink1URL: https://wmsc.lcsc.com/wmsc/upload/file/pdf/v2/lcsc/2304140030_Walsin-Tech-Corp-0603B101K101CT_C424853.pdf; ComponentLink2Description: JLCPCB Part URL; ComponentLink2URL: https://jlcpcb.com/partdetail/C424853; ComponentLink3Description: LCSC Part URL; ComponentLink3URL: https://lcsc.com/product-detail/Multilayer-Ceramic-Capacitors-MLCC---SMD-SMT_Walsin-Tech-Corp-Walsin-Tech-Corp-0603B101K101CT_C424853.html
footprint CAP-0603 (0603 (1608M) Capacitor)
pins: 1, 2

## 0603B101K201CT
designator C?  Capacitance: 100pF  (hidden comment: *)
Capacitor, Ceramic (MLCC), 100pF, ±10%, 200V, X7R, ±10%, SMD 0603; Manufacturer: Walsin Tech Corp; Manufacturer Part Number: 0603B101K201CT; Package Size: 0603; JLCPCB Basic Part: No; JLCPCB Part Number: C384796; Supplier 1: LCSC; Category: Capacitors - MLCC; Supplier Part Number 1: C384796; Tolerance: ±10%; Voltage Rating: 200V; Temperature Coefficient: X7R; RoHS: Yes; ComponentLink1Description: Datasheet; ComponentLink1URL: https://wmsc.lcsc.com/wmsc/upload/file/pdf/v2/lcsc/2304140030_Walsin-Tech-Corp-0603B101K201CT_C384796.pdf; ComponentLink2Description: JLCPCB Part URL; ComponentLink2URL: https://jlcpcb.com/partdetail/C384796; ComponentLink3Description: LCSC Part URL; ComponentLink3URL: https://lcsc.com/product-detail/Multilayer-Ceramic-Capacitors-MLCC---SMD-SMT_Walsin-Tech-Corp-Walsin-Tech-Corp-0603B101K201CT_C384796.html
footprint CAP-0603 (0603 (1608M) Capacitor)
pins: 1, 2

## 0603B101K500CT
designator C?  Capacitance: 100pF  (hidden comment: *)
Capacitor, Ceramic (MLCC), 100pF, ±10%, 50V, X7R, ±10%, SMD 0603; Manufacturer: Walsin Tech Corp; Manufacturer Part Number: 0603B101K500CT; Package Size: 0603; JLCPCB Basic Part: No; JLCPCB Part Number: C123499; Supplier 1: LCSC; Category: Capacitors - MLCC; Supplier Part Number 1: C123499; Tolerance: ±10%; Voltage Rating: 50V; Temperature Coefficient: X7R; RoHS: Yes; ComponentLink1Description: Datasheet; ComponentLink1URL: https://wmsc.lcsc.com/wmsc/upload/file/pdf/v2/lcsc/2304140030_Walsin-Tech-Corp-0603B101K500CT_C123499.pdf; ComponentLink2Description: JLCPCB Part URL; ComponentLink2URL: https://jlcpcb.com/partdetail/C123499; ComponentLink3Description: LCSC Part URL; ComponentLink3URL: https://lcsc.com/product-detail/Multilayer-Ceramic-Capacitors-MLCC---SMD-SMT_Walsin-Tech-Corp-Walsin-Tech-Corp-0603B101K500CT_C123499.html
footprint CAP-0603 (0603 (1608M) Capacitor)
pins: 1, 2

## 0603B101K500NT
designator C?  Capacitance: 100pF  (hidden comment: *)
Capacitor, Ceramic (MLCC), 100pF, ±10%, 50V, X7R, ±10%, SMD 0603; Manufacturer: FH(Guangdong Fenghua Advanced Tech); Manufacturer Part Number: 0603B101K500NT; Package Size: 0603; JLCPCB Basic Part: No; JLCPCB Part Number: C574049; Supplier 1: LCSC; Category: Capacitors - MLCC; Supplier Part Number 1: C574049; Tolerance: ±10%; Voltage Rating: 50V; Temperature Coefficient: X7R; RoHS: Yes; ComponentLink1Description: Datasheet; ComponentLink1URL: https://wmsc.lcsc.com/wmsc/upload/file/pdf/v2/lcsc/2304140030_FH--Guangdong-Fenghua-Advanced-Tech-0603B101K500NT_C574049.pdf; ComponentLink2Description: JLCPCB Part URL; ComponentLink2URL: https://jlcpcb.com/partdetail/C574049; ComponentLink3Description: LCSC Part URL; ComponentLink3URL: https://lcsc.com/product-detail/Multilayer-Ceramic-Capacitors-MLCC---SMD-SMT_FH-Guangdong-Fenghua-Advanced-Tech-FH-Guangdong-Fenghua-Advanced-Tech-0603B101K500NT_C574049.html
footprint CAP-0603 (0603 (1608M) Capacitor)
pins: 1, 2

## 0603B102J500CT
designator C?  Capacitance: 1nF  (hidden comment: *)
Capacitor, Ceramic (MLCC), 1nF, ±5%, 50V, X7R, ±5%, SMD 0603; Manufacturer: Walsin Tech Corp; Manufacturer Part Number: 0603B102J500CT; Package Size: 0603; JLCPCB Basic Part: No; JLCPCB Part Number: C296013; Supplier 1: LCSC; Category: Capacitors - MLCC; Supplier Part Number 1: C296013; Tolerance: ±5%; Voltage Rating: 50V; Temperature Coefficient: X7R; RoHS: Yes; ComponentLink1Description: Datasheet; ComponentLink1URL: https://wmsc.lcsc.com/wmsc/upload/file/pdf/v2/lcsc/2304140030_Walsin-Tech-Corp-0603B102J500CT_C296013.pdf; ComponentLink2Description: JLCPCB Part URL; ComponentLink2URL: https://jlcpcb.com/partdetail/C296013; ComponentLink3Description: LCSC Part URL; ComponentLink3URL: https://lcsc.com/product-detail/Multilayer-Ceramic-Capacitors-MLCC---SMD-SMT_Walsin-Tech-Corp-Walsin-Tech-Corp-0603B102J500CT_C296013.html
footprint CAP-0603 (0603 (1608M) Capacitor)
pins: 1, 2

## 0603B102J500NT
designator C?  Capacitance: 1nF  (hidden comment: *)
Capacitor, Ceramic (MLCC), 1nF, ±5%, 50V, X7R, ±5%, SMD 0603; Manufacturer: FH(Guangdong Fenghua Advanced Tech); Manufacturer Part Number: 0603B102J500NT; Package Size: 0603; JLCPCB Basic Part: No; JLCPCB Part Number: C8808; Supplier 1: LCSC; Category: Capacitors - MLCC; Supplier Part Number 1: C8808; Tolerance: ±5%; Voltage Rating: 50V; Temperature Coefficient: X7R; RoHS: Yes; ComponentLink1Description: Datasheet; ComponentLink1URL: https://wmsc.lcsc.com/wmsc/upload/file/pdf/v2/lcsc/2304140030_FH--Guangdong-Fenghua-Advanced-Tech-0603B102J500NT_C8808.pdf; ComponentLink2Description: JLCPCB Part URL; ComponentLink2URL: https://jlcpcb.com/partdetail/C8808; ComponentLink3Description: LCSC Part URL; ComponentLink3URL: https://lcsc.com/product-detail/Multilayer-Ceramic-Capacitors-MLCC---SMD-SMT_FH-Guangdong-Fenghua-Advanced-Tech-FH-Guangdong-Fenghua-Advanced-Tech-0603B102J500NT_C8808.html
footprint CAP-0603 (0603 (1608M) Capacitor)
pins: 1, 2

## 0603B102K101CT
designator C?  Capacitance: 1nF  (hidden comment: *)
Capacitor, Ceramic (MLCC), 1nF, ±10%, 100V, X7R, ±10%, SMD 0603; Manufacturer: Walsin Tech Corp; Manufacturer Part Number: 0603B102K101CT; Package Size: 0603; JLCPCB Basic Part: No; JLCPCB Part Number: C77438; Supplier 1: LCSC; Category: Capacitors - MLCC; Supplier Part Number 1: C77438; Tolerance: ±10%; Voltage Rating: 100V; Temperature Coefficient: X7R; RoHS: Yes; ComponentLink1Description: Datasheet; ComponentLink1URL: https://wmsc.lcsc.com/wmsc/upload/file/pdf/v2/lcsc/2304140030_Walsin-Tech-Corp-0603B102K101CT_C77438.pdf; ComponentLink2Description: JLCPCB Part URL; ComponentLink2URL: https://jlcpcb.com/partdetail/C77438; ComponentLink3Description: LCSC Part URL; ComponentLink3URL: https://lcsc.com/product-detail/Multilayer-Ceramic-Capacitors-MLCC---SMD-SMT_Walsin-Tech-Corp-Walsin-Tech-Corp-0603B102K101CT_C77438.html
footprint CAP-0603 (0603 (1608M) Capacitor)
pins: 1, 2

## 0603B102K101NT
designator C?  Capacitance: 1nF  (hidden comment: *)
Capacitor, Ceramic (MLCC), 1nF, ±10%, 100V, X7R, ±10%, SMD 0603; Manufacturer: FH(Guangdong Fenghua Advanced Tech); Manufacturer Part Number: 0603B102K101NT; Package Size: 0603; JLCPCB Basic Part: No; JLCPCB Part Number: C43847; Supplier 1: LCSC; Category: Capacitors - MLCC; Supplier Part Number 1: C43847; Tolerance: ±10%; Voltage Rating: 100V; Temperature Coefficient: X7R; RoHS: Yes; ComponentLink1Description: Datasheet; ComponentLink1URL: https://wmsc.lcsc.com/wmsc/upload/file/pdf/v2/lcsc/2304140030_FH--Guangdong-Fenghua-Advanced-Tech-0603B102K101NT_C43847.pdf; ComponentLink2Description: JLCPCB Part URL; ComponentLink2URL: https://jlcpcb.com/partdetail/C43847; ComponentLink3Description: LCSC Part URL; ComponentLink3URL: https://lcsc.com/product-detail/Multilayer-Ceramic-Capacitors-MLCC---SMD-SMT_FH-Guangdong-Fenghua-Advanced-Tech-FH-Guangdong-Fenghua-Advanced-Tech-0603B102K101NT_C43847.html
footprint CAP-0603 (0603 (1608M) Capacitor)
pins: 1, 2

## 0603B102K160CT
designator C?  Capacitance: 1nF  (hidden comment: *)
Capacitor, Ceramic (MLCC), 1nF, ±10%, 16V, X7R, ±10%, SMD 0603; Manufacturer: Walsin Tech Corp; Manufacturer Part Number: 0603B102K160CT; Package Size: 0603; JLCPCB Basic Part: No; JLCPCB Part Number: C163169; Supplier 1: LCSC; Category: Capacitors - MLCC; Supplier Part Number 1: C163169; Tolerance: ±10%; Voltage Rating: 16V; Temperature Coefficient: X7R; RoHS: Yes; ComponentLink1Description: Datasheet; ComponentLink1URL: https://wmsc.lcsc.com/wmsc/upload/file/pdf/v2/lcsc/2304140030_Walsin-Tech-Corp-0603B102K160CT_C163169.pdf; ComponentLink2Description: JLCPCB Part URL; ComponentLink2URL: https://jlcpcb.com/partdetail/C163169; ComponentLink3Description: LCSC Part URL; ComponentLink3URL: https://lcsc.com/product-detail/Multilayer-Ceramic-Capacitors-MLCC---SMD-SMT_Walsin-Tech-Corp-Walsin-Tech-Corp-0603B102K160CT_C163169.html
footprint CAP-0603 (0603 (1608M) Capacitor)
pins: 1, 2

## 0603B102K201CT
designator C?  Capacitance: 1nF  (hidden comment: *)
Capacitor, Ceramic (MLCC), 1nF, ±10%, 200V, X7R, ±10%, SMD 0603; Manufacturer: Walsin Tech Corp; Manufacturer Part Number: 0603B102K201CT; Package Size: 0603; JLCPCB Basic Part: No; JLCPCB Part Number: C384795; Supplier 1: LCSC; Category: Capacitors - MLCC; Supplier Part Number 1: C384795; Tolerance: ±10%; Voltage Rating: 200V; Temperature Coefficient: X7R; RoHS: Yes; ComponentLink1Description: Datasheet; ComponentLink1URL: https://wmsc.lcsc.com/wmsc/upload/file/pdf/v2/lcsc/2107272240_Walsin-Tech-Corp-0603B102K201CT_C384795.pdf; ComponentLink2Description: JLCPCB Part URL; ComponentLink2URL: https://jlcpcb.com/partdetail/C384795; ComponentLink3Description: LCSC Part URL; ComponentLink3URL: https://lcsc.com/product-detail/Multilayer-Ceramic-Capacitors-MLCC---SMD-SMT_Walsin-Tech-Corp-Walsin-Tech-Corp-0603B102K201CT_C384795.html
footprint CAP-0603 (0603 (1608M) Capacitor)
pins: 1, 2

## 0603B102K201NT
designator C?  Capacitance: 1nF  (hidden comment: *)
Capacitor, Ceramic (MLCC), 1nF, ±10%, 200V, X7R, ±10%, SMD 0603; Manufacturer: FH(Guangdong Fenghua Advanced Tech); Manufacturer Part Number: 0603B102K201NT; Package Size: 0603; JLCPCB Basic Part: No; JLCPCB Part Number: C913913; Supplier 1: LCSC; Category: Capacitors - MLCC; Supplier Part Number 1: C913913; Tolerance: ±10%; Voltage Rating: 200V; Temperature Coefficient: X7R; RoHS: Yes; ComponentLink1Description: Datasheet; ComponentLink1URL: https://wmsc.lcsc.com/wmsc/upload/file/pdf/v2/lcsc/2304140030_FH--Guangdong-Fenghua-Advanced-Tech-0603B102K201NT_C913913.pdf; ComponentLink2Description: JLCPCB Part URL; ComponentLink2URL: https://jlcpcb.com/partdetail/C913913; ComponentLink3Description: LCSC Part URL; ComponentLink3URL: https://lcsc.com/product-detail/Multilayer-Ceramic-Capacitors-MLCC---SMD-SMT_FH-Guangdong-Fenghua-Advanced-Tech-FH-Guangdong-Fenghua-Advanced-Tech-0603B102K201NT_C913913.html
footprint CAP-0603 (0603 (1608M) Capacitor)
pins: 1, 2

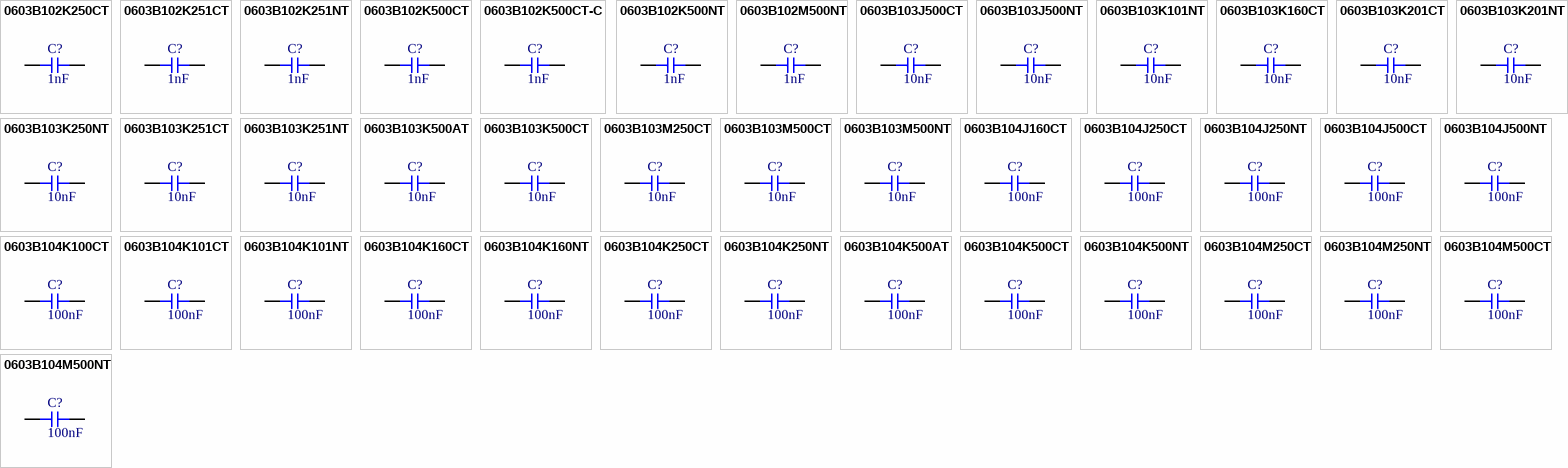
[diagram p1: symbols 0603B102K250CT to 0603B104M500NT]

## 0603B102K250CT
designator C?  Capacitance: 1nF  (hidden comment: *)
Capacitor, Ceramic (MLCC), 1nF, ±10%, 25V, X7R, ±10%, SMD 0603; Manufacturer: Walsin Tech Corp; Manufacturer Part Number: 0603B102K250CT; Package Size: 0603; JLCPCB Basic Part: No; JLCPCB Part Number: C163170; Supplier 1: LCSC; Category: Capacitors - MLCC; Supplier Part Number 1: C163170; Tolerance: ±10%; Voltage Rating: 25V; Temperature Coefficient: X7R; RoHS: Yes; ComponentLink1Description: Datasheet; ComponentLink1URL: https://wmsc.lcsc.com/wmsc/upload/file/pdf/v2/lcsc/2304140030_Walsin-Tech-Corp-0603B102K250CT_C163170.pdf; ComponentLink2Description: JLCPCB Part URL; ComponentLink2URL: https://jlcpcb.com/partdetail/C163170; ComponentLink3Description: LCSC Part URL; ComponentLink3URL: https://lcsc.com/product-detail/Multilayer-Ceramic-Capacitors-MLCC---SMD-SMT_Walsin-Tech-Corp-Walsin-Tech-Corp-0603B102K250CT_C163170.html
footprint CAP-0603 (0603 (1608M) Capacitor)
pins: 1, 2

## 0603B102K251CT
designator C?  Capacitance: 1nF  (hidden comment: *)
Capacitor, Ceramic (MLCC), 1nF, ±10%, 250V, X7R, ±10%, SMD 0603; Manufacturer: Walsin Tech Corp; Manufacturer Part Number: 0603B102K251CT; Package Size: 0603; JLCPCB Basic Part: No; JLCPCB Part Number: C384794; Supplier 1: LCSC; Category: Capacitors - MLCC; Supplier Part Number 1: C384794; Tolerance: ±10%; Voltage Rating: 250V; Temperature Coefficient: X7R; RoHS: Yes; ComponentLink1Description: Datasheet; ComponentLink1URL: https://wmsc.lcsc.com/wmsc/upload/file/pdf/v2/lcsc/2304140030_Walsin-Tech-Corp-0603B102K251CT_C384794.pdf; ComponentLink2Description: JLCPCB Part URL; ComponentLink2URL: https://jlcpcb.com/partdetail/C384794; ComponentLink3Description: LCSC Part URL; ComponentLink3URL: https://lcsc.com/product-detail/Multilayer-Ceramic-Capacitors-MLCC---SMD-SMT_Walsin-Tech-Corp-Walsin-Tech-Corp-0603B102K251CT_C384794.html
footprint CAP-0603 (0603 (1608M) Capacitor)
pins: 1, 2
